# Altium footprint library mmyLibrary.PcbLib: 231 footprints (part 13 of 15)
Each footprint in its own frame and in the unit in brackets; x right, y up, seen from the top. Pads: shape width x height; smd on the part's side, far side on the other; paste and mask are expansions set on the pad; w line width, h text height; cw(c..) or ccw(c..) is an arc to the next point about the centre after c.
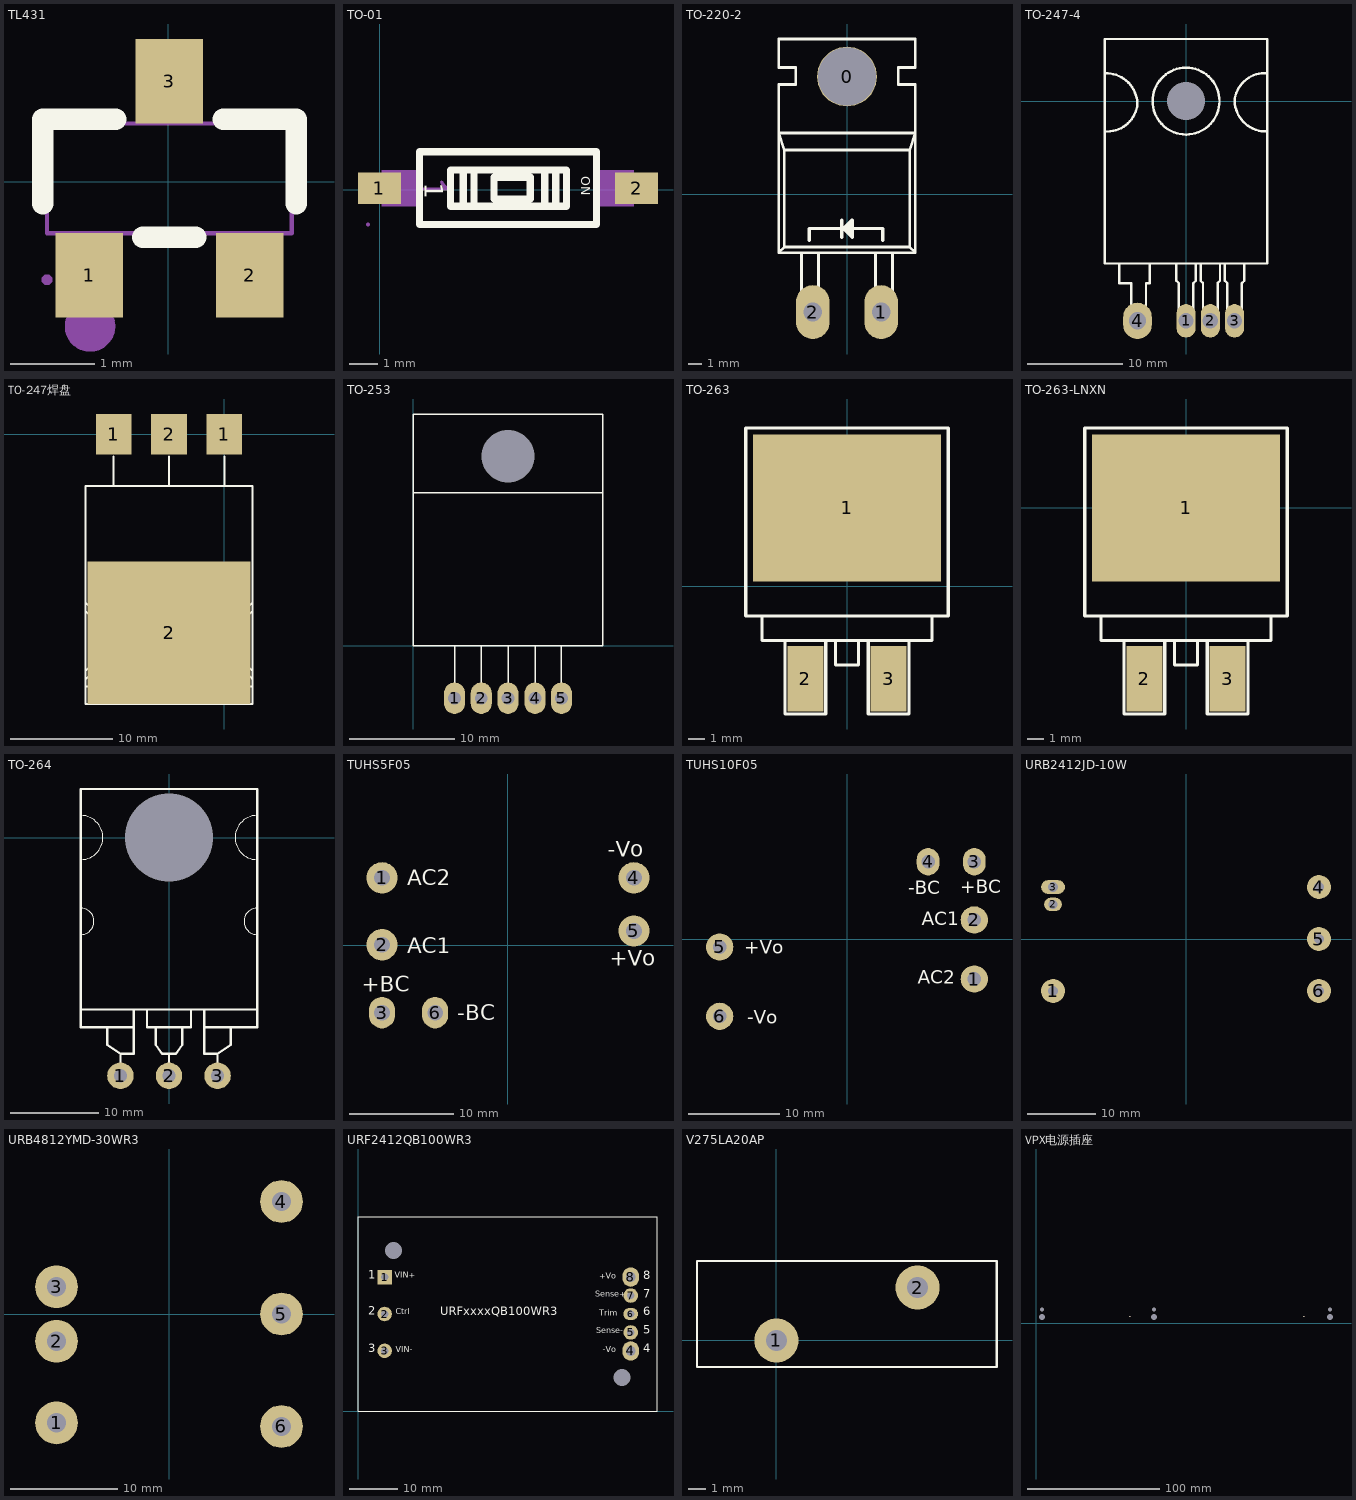
[diagram p12: the footprints below, top view; thin cyan lines are the x and y axes]

## TL431 [mm] "安邦AnBon"
pads (3):
  rect 0.8x1 smd mask+0.051: 1(-0.936,-1.11) 2(0.964,-1.11) 3(0.014,1.19)
Top Overlay:
  lines w0.254: -1.486,-0.26 -1.486,0.74 -0.622,0.74 ; -0.3,-0.66 0.328,-0.66 ; 0.65,0.74 1.514,0.74 1.514,-0.26
Mechanical 6:
  circle w0.3: c-0.926,-1.713 r0.15
Mechanical 15:
  region: -1.436,-1.22 -1.411,-1.22 -1.376,-1.185 -1.376,-1.135 -1.411,-1.1 -1.436,-1.1 -1.461,-1.1 -1.496,-1.135 -1.496,-1.185 -1.461,-1.22
  region: -1.136,-0.6 -0.736,-0.6 -0.736,-0.77 -1.136,-0.77
  region: -1.136,-0.76 -0.736,-0.76 -0.736,-1.16 -1.136,-1.16
  region: 0.764,-0.6 1.164,-0.6 1.164,-0.77 0.764,-0.77
  region: 0.764,-0.76 1.164,-0.76 1.164,-1.16 0.764,-1.16
  region: -0.186,0.85 0.214,0.85 0.214,0.68 -0.186,0.68
  region: -0.186,1.24 0.214,1.24 0.214,0.84 -0.186,0.84
  lines w0.051: -1.436,-0.61 1.464,-0.61 1.464,0.69 -1.436,0.69 -1.436,-0.61

## TO-01 [mm] "2pin拨码"
pads (2):
  rect 1.5x1.1 smd mask+0.051: 1(-0.012,0.06) 2(8.988,0.06)
Top Overlay:
  lines w0.254: 2.918,-0.575 2.918,0.695 ; 3.299,-0.575 3.299,0.695 ; 5.776,-0.575 5.776,0.695 ; 6.157,-0.575 6.157,0.695 ; 1.388,-1.21 1.388,1.33 7.588,1.33 7.588,-1.21 1.388,-1.21 ; 2.474,-0.575 6.538,-0.575 6.538,0.695 2.474,0.695 2.474,-0.575 ; 3.998,-0.321 5.268,-0.321 5.268,0.441 3.998,0.441 3.998,-0.321
  text "1" at 1.578,0.25 h0.65
  text "ON" at 7.058,0.484 h0.32
Mechanical 6:
  region: 2.173,0.32 2.153,0.32 2.113,0.28 2.133,0.21 2.173,0.14 2.233,0.08 1.413,0.08 1.403,0.09 1.383,0.09 1.353,0.06 1.353,0.02 1.363,-0.01 1.393,-0.02 2.373,-0.02 2.383,-0.02 2.398,-0.015 2.408,-0.005 2.418,0.005 2.423,0.03 2.413,0.05 2.393,0.08 2.363,0.11 2.273,0.2 2.213,0.3
Mechanical 15:
  region: -0.352,-1.21 -0.352,-1.185 -0.387,-1.15 -0.437,-1.15 -0.472,-1.185 -0.472,-1.21 -0.472,-1.235 -0.437,-1.27 -0.387,-1.27 -0.352,-1.235
  region: -0.412,-0.19 -0.412,0.31 0.088,0.31 0.088,-0.19
  region: 8.888,-0.19 8.888,0.31 9.388,0.31 9.388,-0.19
  region: 7.578,-0.575 7.578,0.695 8.898,0.695 8.898,-0.575
  region: 1.398,0.695 1.398,-0.575 0.078,-0.575 0.078,0.695
  lines w0.051: 1.388,-1.21 1.388,1.33 7.588,1.33 7.588,-1.21 1.388,-1.21

## TO-220-2 [mil]
pads (3):
  round 175 hole 170: 0(0,344.5)
  oval 98.42x157.48 hole 55: 1(100,-344.5) 2(-100,-344.5)
Top Overlay:
  lines w7.87: -133.33,-170.5 -133.33,-295.5 -125.8,-311.44 ; -83.33,-311.44 -83.33,-170.5 ; 83.33,-311.44 83.33,-170.5 ; 128,-311.44 133.33,-295.5 133.33,-170.5 ; -200,-170.5 -200,321.17 -150,321.17 -150,371.17 -200,371.17 -200,454.5 200,454.5 200,371.17 150,371.17 150,321.17 200,321.17 200,221.17 200,-170.5 ; -200,-170.5 200,-170.5 ; -200,-170.5 -183.33,-153.83 ; -183.33,-153.83 -183.33,129.5 ; -183.33,-153.83 183.33,-153.83 ; -183.33,129.5 -200,179.5 200,179.5 183.33,129.5 ; -183.33,129.5 183.33,129.5 ; 183.33,-153.83 200,-170.5 ; 183.33,-153.83 183.33,129.5
  lines w10: -110,-135 -110,-100 105,-100 105,-135 ; -15,-125 -15,-75 ; 2.5,-87.5 2.5,-112.5 10,-100 ; 10,-120 10,-85 ; -10,-100 15,-75 15,-125 -10,-100

## TO-247-4 [mm]
pads (5):
  round 0 hole 4: 0(0,0)
  oval 2x3.5 hole 1.6: 1(0,-23) 2(2.54,-23) 3(5.08,-23)
  oval 3x3.8 hole 1.8: 4(-5.08,-23)
Top Overlay:
  circle w0.254: c0,0 r3.5
  lines w0.254: -8.509,-3.175 ccw(c-8.26,-0.005) -5.089,-0.254 ccw(c-8.386,-0.376) -8.509,2.921 ; -6.985,-17.127 -6.985,-19.05 -5.715,-19.05 -5.715,-23.495 ; -4.191,-23.368 -4.191,-19.05 -3.81,-19.05 -3.81,-17.018 ; -1.016,-17.018 -1.016,-18.796 -0.762,-19.05 -0.762,-23.114 ; 0.762,-23.368 0.762,-19.05 1.016,-18.796 1.016,-17.145 ; 1.524,-17.018 1.524,-18.796 1.778,-19.05 1.778,-23.114 ; 3.302,-23.114 3.302,-19.05 3.556,-18.796 3.556,-17.145 ; 4.064,-17.018 4.064,-18.796 4.318,-19.05 4.318,-22.987 ; 5.842,-22.987 5.842,-19.05 6.096,-18.796 6.096,-17.145 ; 8.5,-3.175 cw(c8.377,0.122) 5.08,0 cw(c8.251,-0.249) 8.5,2.921 ; -8.5,-17 8.5,-17 8.5,6.5 -8.5,6.5 -8.5,-17

## TO-247焊盘 [mm]
pads (4):
  rect 3.5x4 smd: 1(-10.9,0) 1(0,0) 2(-5.45,0)
  rect 16x14 smd: 2(-5.45,-19.5)
Top Overlay:
  circle w0.2: c-5.45,-20.7 r2
  lines w0.2: -13.65,-24.8 2.75,-24.8 ; -13.65,-24.075 -11.8,-22.225 ; -13.65,-23.228 -12.435,-22.013 ; -13.65,-17.412 -12.435,-18.627 ; -13.65,-16.565 -11.8,-18.415 ; -10.9,-5.08 -10.9,-2.2 ; -5.45,-5.08 -5.45,-2.2 ; 0,-5.08 0,-2.2 ; 2.729,-24.054 0.9,-22.225 ; 2.75,-23.228 1.535,-22.013 ; 2.75,-17.412 1.535,-18.627 ; 2.75,-16.565 0.9,-18.415 ; -12.435,-22.013 -12.435,-18.627 ; -12.435,-22.013 -11.8,-22.225 ; -12.435,-18.627 -11.8,-18.415 ; -11.8,-22.225 -11.8,-18.415 ; 0.9,-22.225 0.9,-18.415 ; 0.9,-22.225 1.535,-22.013 ; 0.9,-18.415 1.535,-18.627 ; 1.535,-22.013 1.535,-18.627 ; -13.65,-26.5 -13.65,-5.08 2.75,-5.08 2.75,-26.5 -13.65,-26.5

## TO-253 [mm]
pads (6):
  round 0 hole 5: 0(9,18)
  oval 2x3 hole 1.2: 1(3.92,-5) 2(6.46,-5) 3(9,-5) 4(11.57,-5) 5(14.08,-5)
Top Overlay:
  lines w0.127: 0,14.5 18,14.5 ; 3.92,-5 3.92,-0.017 ; 6.46,-5 6.46,-0.017 ; 9,-5 9,-0.017 ; 11.57,-5 11.57,0 ; 14.08,-5 14.08,-0.017 ; 0,0 0,22 18,22 18,0 0,0

## TO-263 [mm]
height 4.5
pads (3):
  rect 11.5x9 smd: 1(0,4.786)
  rect 2.2x4 smd: 2(-2.54,-5.675) 3(2.54,-5.675)
Top Overlay:
  lines w0.2: -3.8,-3.325 -3.8,-7.825 -1.3,-7.825 -1.3,-3.325 ; -0.7,-3.325 -0.7,-4.825 0.7,-4.825 0.7,-3.325 ; 1.3,-3.325 1.3,-7.825 3.8,-7.825 3.8,-3.335 ; -5.2,-1.825 -6.2,-1.825 -6.2,9.675 6.2,9.675 6.2,-1.825 5.2,-1.825 ; -5.2,-1.825 5.2,-1.825 ; -5.2,-1.825 -5.2,-3.325 5.2,-3.325 5.2,-1.825

## TO-263-LNXN [mm]
pads (3):
  rect 11.5x9 smd: 1(0,0)
  rect 2.2x4 smd: 2(-2.54,-10.461) 3(2.54,-10.461)
Top Overlay:
  lines w0.2: -3.8,-8.111 -3.8,-12.611 -1.3,-12.611 -1.3,-8.111 ; -0.7,-8.111 -0.7,-9.611 0.7,-9.611 0.7,-8.111 ; 1.3,-8.111 1.3,-12.611 3.8,-12.611 3.8,-8.121 ; -5.2,-6.611 -6.2,-6.611 -6.2,4.889 6.2,4.889 6.2,-6.611 5.2,-6.611 ; -5.2,-6.611 5.2,-6.611 ; -5.2,-6.611 -5.2,-8.111 5.2,-8.111 5.2,-6.611

## TO-264 [mm]
pads (4):
  round 0 hole 10: 0(0,0)
  round 3 hole 1.5: 1(-5.5,-27) 2(0,-27) 3(5.5,-27)
Top Overlay:
  lines w0.1: -10,-11 ccw(c-10,-9.5) -10,-8 ; -10,-2.5 ccw(c-10,0) -10,2.5 ; 10,-11 cw(c10,-9.5) 10,-8 ; 10,-2.5 cw(c10,0) 10,2.5
  lines w0.254: -10,-19.5 10,-19.5 ; -7,-21.5 -7,-23.5 -5.5,-24.5 ; -5.5,-27 -5.5,-24.5 ; -4,-19.5 -4,-21.5 ; -2.5,-19.5 -2.5,-21.5 2.5,-21.5 2.5,-19.5 ; -1.5,-21.5 -1.5,-23.5 -0.8,-24.5 0.8,-24.5 1.5,-23.5 1.5,-21.5 ; 0,-27 0,-24.5 ; 4,-19.5 4,-21.5 ; 5.5,-27 5.5,-24.5 ; 7,-21.5 7,-23.5 5.5,-24.5 ; -5.5,-24.5 -4,-24.5 -4,-21.5 ; -4,-21.5 -10,-21.5 -10,5.5 10,5.5 10,-21.5 4,-21.5 ; 4,-21.5 4,-24.5 5.5,-24.5

## TUHS5F05 [mm]
pads (6):
  round 3 hole 1.5: 1(-12.05,6.45) 2(-12.05,0.05) 4(12.05,6.45) 5(12.05,1.37)
  oval 2.5x3 hole 1.5: 3(-12.05,-6.45) 6(-6.97,-6.45)
Top Overlay:
  text "AC1" at -9.65,-0.75 h1.5
  text "+BC" at -13.97,-4.445 h1.5
  text "-Vo" at 9.55,8.45 h1.5
  text "-BC" at -4.85,-7.15 h1.5
  text "+Vo" at 9.75,-1.95 h1.5
  text "AC2" at -9.65,5.75 h1.5
Bottom Overlay:
  lines w0.254: -14.35,-8.75 14.35,-8.75 14.35,8.75 -14.35,8.75 -14.35,-8.75
  text "+Vo" at 10.15,0.75 h1.5
  text "-Vo" at 10.15,5.95 h1.5
  text "-BC" at -4.85,-5.65 h1.5
  text "AC2" at -9.75,7.15 h1.5
  text "AC1" at -9.55,0.75 h1.5
  text "+BC" at -14.15,-3.05 h1.5

## TUHS10F05 [mm]
pads (6):
  round 3 hole 1.5: 1(14,-4.4) 2(14,2.1) 5(-14,-0.88) 6(-14,-8.5)
  oval 2.5x3 hole 1.5: 3(14,8.5) 4(8.92,8.5)
Top Overlay:
  text "AC1" at 8.2,1.5 h1.5
  text "+BC" at 12.436,5.031 h1.5
  text "-Vo" at -11,-9.3 h1.5
  text "-BC" at 6.721,4.904 h1.5
  text "+Vo" at -11.3,-1.6 h1.5
  text "AC2" at 7.8,-4.9 h1.5
Bottom Overlay:
  lines w0.254: -16.5,-11 16.5,-11 16.5,11 -16.5,11 -16.5,-11
  text "+Vo" at -7.1,-1.6 h1.5
  text "-Vo" at -6.9,-9.3 h1.5
  text "-BC" at 7,7.9 h1.5
  text "AC2" at 11.9,-4.9 h1.5
  text "AC1" at 11.7,1.5 h1.5
  text "+BC" at 16.3,5.3 h1.5

## URB2412JD-10W [mm]
pads (6):
  round 3.5 hole 1.5: 1(-19.5,-7.62) 4(19.5,7.62) 5(19.5,0) 6(19.5,-7.62)
  oval 2.6x2 hole 1.3: 2(-19.5,5.08)
  oval 3.5x2 hole 1.5: 3(-19.5,7.62)
Bottom Overlay:
  lines w0.127: -22,-11.5 -22,11.5 22,11.5 22,-11.5 -22,-11.5
  text "VOUT+" at 15.875,-8.255 h2
  text "TRIM" at 15.494,-0.635 h2
  text "VOUT-" at 15.875,6.985 h2
  text "VIN-" at -11.43,6.985 h2
  text "CTRL" at -11.176,4.572 h2
  text "VIN+" at -11.938,-8.255 h2
  text "6" at 17.145,-8.255 h2
  text "5" at 17.018,-0.635 h2
  text "4" at 17.018,6.985 h2
  text "3" at -16.51,6.985 h2
  text "2" at -16.51,4.572 h2
  text "1" at -16.51,-8.255 h2

## URB4812YMD-30WR3 [mm]
pads (6):
  round 4 hole 1.8: 1(-10.5,-10.16) 2(-10.5,-2.54) 3(-10.5,2.54) 4(10.5,10.5) 5(10.5,0) 6(10.5,-10.5)
Bottom Overlay:
  lines w0.127: -14,-14 -14,14 14,14 14,-14 -14,-14
  text "6" at 7.366,-10.795 h2
  text "5" at 7.493,-0.635 h2
  text "4" at 7.493,9.906 h2
  text "3" at -6.985,1.905 h2
  text "2" at -7.112,-2.921 h2
  text "1" at -6.985,-11.049 h2
  text "Ctrl" at -2.921,-10.922 h2
  text "GND" at -2.54,-2.921 h2
  text "VIN+" at -2.286,1.905 h2
  text "VOUT+" at 6.096,9.906 h2
  text "TRIM" at 6.096,-0.635 h2
  text "VOUT-" at 6.223,-10.795 h2

## URF2412QB100WR3 [mm] "L61.8mm*W40.2mm*H12.7mm"
height 12.7
pads (10):
  rect 3x3 hole 1.5: 1(5.5,27.72)
  round 3 hole 1.5: 2(5.5,20.1) 3(5.5,12.48) 5(56.3,16.29) 7(56.3,23.91)
  round 0 hole 3.5: 2(7.3,33.2) 3(54.5,7)
  oval 3.5x4 hole 2: 4(56.3,12.48) 8(56.3,27.72)
  oval 3x2.5 hole 1.5: 6(56.3,20.1)
Top Overlay:
  lines w0.127: 0,0 61.8,0 61.8,40.2 0,40.2 0,0
  text "8" at 58.928,26.67 h3
  text "7" at 58.928,22.86 h3
  text "6" at 58.928,19.177 h3
  text "5" at 58.928,15.367 h3
  text "4" at 58.928,11.557 h3
  text "3" at 2.159,11.557 h3
  text "2" at 2.159,19.304 h3
  text "URFxxxxQB100WR3" at 17.018,19.177 h3
  text "VIN+" at 7.62,27.178 h2
  text "Ctrl" at 7.747,19.685 h2
  text "VIN-" at 7.747,11.811 h2
  text "-Vo" at 50.546,11.811 h2
  text "Sense-" at 49.149,15.748 h2
  text "Trim" at 49.784,19.304 h2
  text "Sense+" at 49.022,23.241 h2
  text "+Vo" at 49.784,26.924 h2
  text "1" at 2.159,26.797 h3
Bottom Overlay:
  text "8" at 60.071,26.67 h3
  text "7" at 59.944,22.86 h3
  text "6" at 59.944,19.177 h3
  text "5" at 60.071,15.367 h3
  text "4" at 60.071,11.557 h3
  text "1" at 3.048,26.797 h3
  text "VIN+" at 11.938,27.178 h2
  text "2" at 3.302,19.304 h3
  text "Ctrl" at 10.922,19.685 h2
  text "3" at 3.175,11.557 h3
  text "VIN-" at 11.684,11.811 h2
  text "+Vo" at 52.959,26.924 h2
  text "Sense+" at 54.102,23.241 h2
  text "Trim" at 53.721,19.304 h2
  text "Sense-" at 53.975,15.748 h2
  text "-Vo" at 53.213,11.811 h2
  text "URFxxxxQB100WR3" at 41.91,19.304 h3

## V275LA20AP [mm] "5.6mm*17mm"
height 27.5
pads (2):
  round 2.5 hole 1.2: 1(0,0) 2(8,3)
Top Overlay:
  lines w0.127: 12.491,-1.5 12.491,4.5 ; 12.5,-1.5 -4.5,-1.5 -4.5,4.5 12.5,4.5

## VPX电源插座 [mm]
pads (6):
  round 0 hole 4.7: 0(4.65,4.75) 0(89.35,4.75) 0(222.71,4.75)
  round 0 hole 3: 0(4.65,10.25) 0(89.35,10.25) 0(222.71,10.25)
via 203.02,5.08 diameter 1 hole 0.5
via 71.12,5.08 diameter 1 hole 0.5
Bottom Overlay:
  lines w0.254: 0,0 0,13.843 227.36,13.843 227.36,0 0,0